# Altium footprint library Module.PcbLib: 42 footprints (part 2 of 3)
Each footprint in its own frame and in the unit in brackets; x right, y up, seen from the top. Pads: shape width x height; smd on the part's side, far side on the other; paste and mask are expansions set on the pad; w line width, h text height; cw(c..) or ccw(c..) is an arc to the next point about the centre after c.
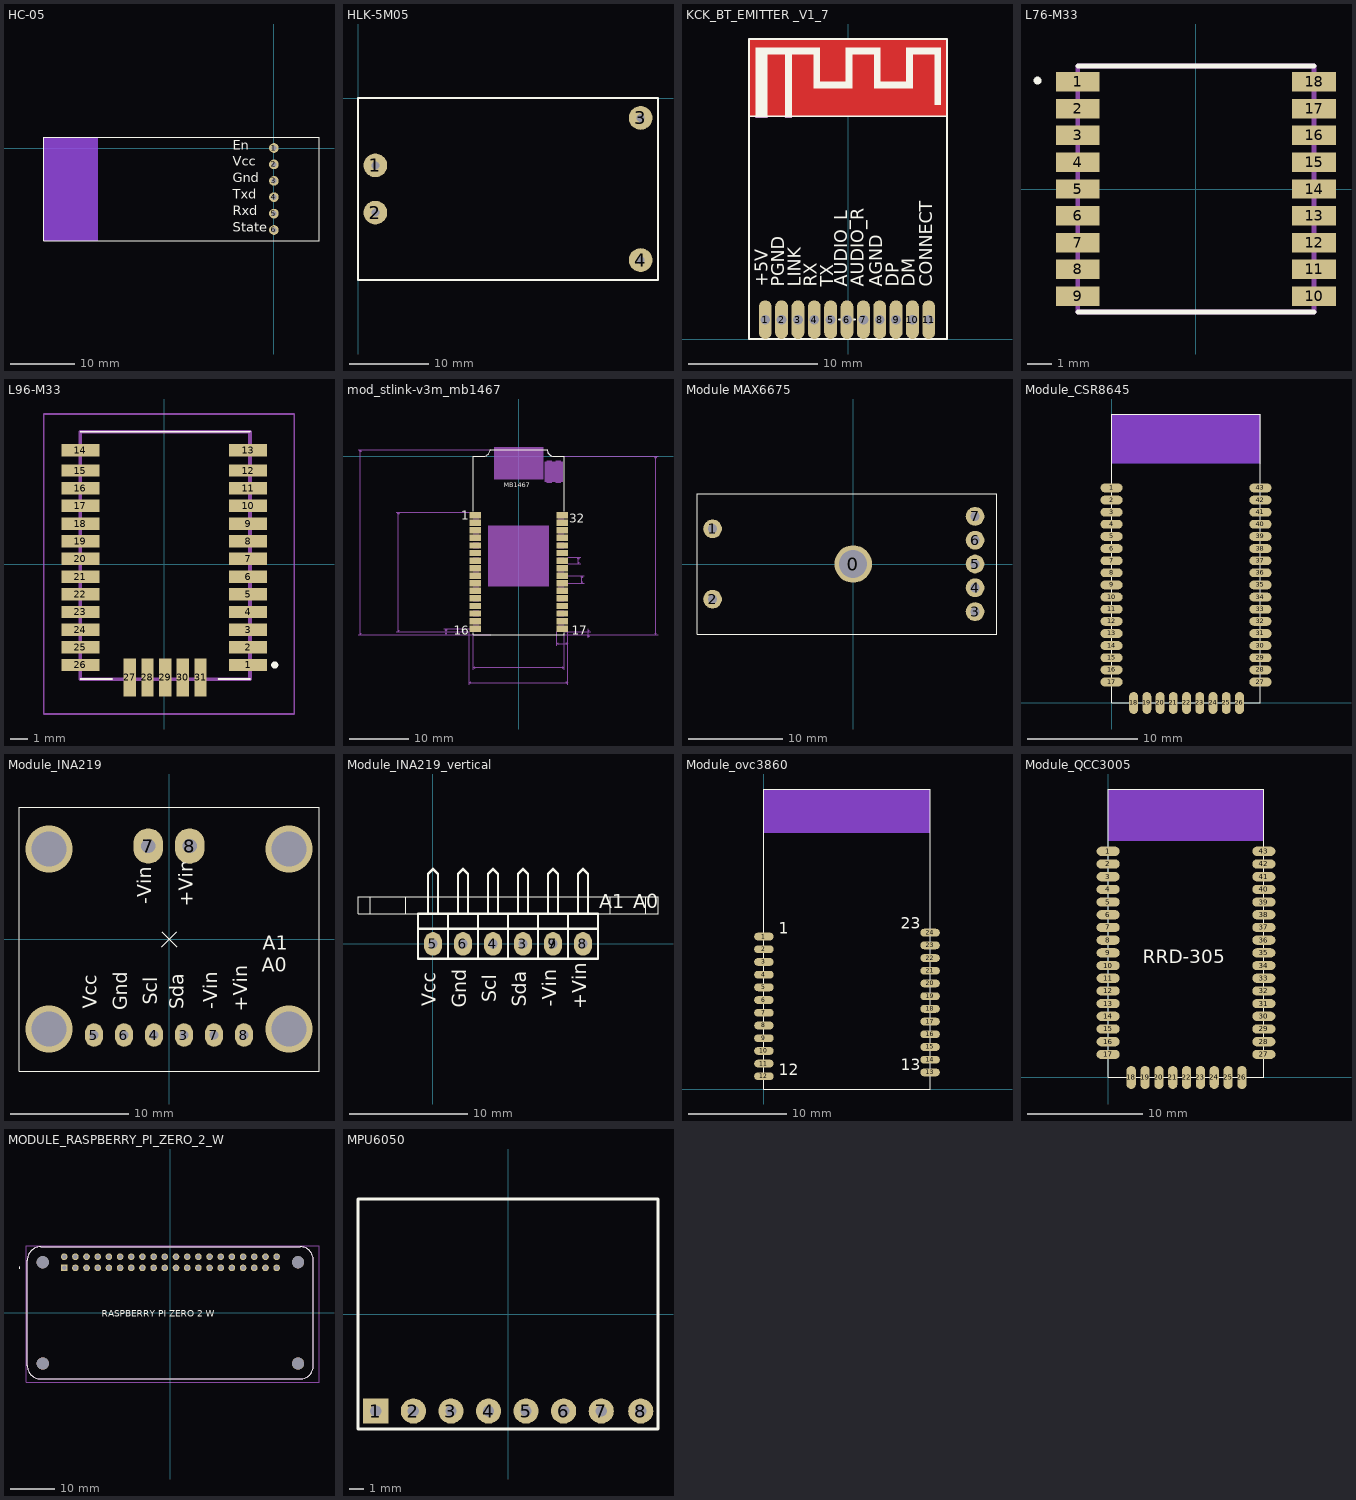
[diagram p1: the footprints below, top view; thin cyan lines are the x and y axes]

## HC-05 [mm]
pads (6):
  round 1.5 hole 0.8: 1(0,0) 2(0,-2.54) 3(0,-5.08) 4(0,-7.62) 5(0,-10.16) 6(0,-12.7)
Top Layer keep-out:
  region: -27.25,-14.4 -27.25,1.7 -35.615,1.7 -35.615,-14.4
Bottom Layer keep-out:
  region: -27.25,-14.4 -27.25,1.7 -35.615,1.7 -35.615,-14.4
Top Overlay:
  lines w0.1: -35.615,-14.4 -35.615,1.7 6.985,1.7 6.985,-14.4 -35.615,-14.4
  text "En" at -6.35,-0.801 h2.5
  text "Vcc" at -6.348,-3.328 h2.5
  text "Gnd" at -6.35,-5.881 h2.5
  text "Txd" at -6.35,-8.408 h2.5
  text "Rxd" at -6.35,-10.948 h2.5
  text "State" at -6.35,-13.501 h2.5
3D body "User Library-hc05.step": height 5.9, standoff 0, extent -35.615,-14.4 6.985,1.7

## HC-SR04 [mm] "HC-SR04"
3D body "User Library-HC-SR04.STEP": height 12, standoff -6.07, extent 0,-4.68 45,20.5

## HLK-5M05 [mm] "5W ultra-compact AC/DC power module HLK-5M05"
height 18
pads (4):
  round 3 hole 1: 1(2.2,-8.5) 2(2.2,-14.5) 3(35.8,-2.5) 4(35.8,-20.5)
Top Overlay:
  lines w0.254: 0,-23 0,0 38,0 38,-23 0,-23
3D body: height 18, standoff 0.25, extent 0,-23 38,0
3D body: height 0.25, standoff 0, extent 0,0 0,0
3D body: height 0.25, standoff 0, extent 5.1,-18.8 5.1,-18.8

## KCK_BT_EMITTER _V1_7 [mm]
pads (11):
  oval 1x3 hole 0.762: 1(-6.43,1.5) 2(-5.16,1.5) 3(-3.89,1.5) 4(-2.62,1.5) 5(-1.35,1.5) 6(-0.08,1.5) 7(1.19,1.5) 8(2.46,1.5) 9(3.73,1.5) 10(5,1.5) 11(6.27,1.5)
Top Layer:
  pour cut-out: -7.7,17.3 -7.7,23.3 7.7,23.3 7.7,17.3
Bottom Layer:
  pour cut-out: -7.7,17.3 -7.7,23.3 7.7,23.3 7.7,17.3
Top Overlay:
  region: 7.22,18.18 7.22,22.62 4.52,22.62 4.52,19.98 2.52,19.98 2.52,22.62 -0.18,22.62 -0.18,19.98 -2.18,19.98 -2.18,22.62 -7.18,22.62 -7.18,17.22 -6.28,17.22 -6.28,22.12 -4.88,22.12 -4.88,17.22 -4.38,17.22 -4.38,22.12 -2.68,22.12 -2.68,19.48 0.32,19.48 0.32,22.12 2.02,22.12 2.02,19.48 5.02,19.48 5.02,22.12 6.72,22.12 6.72,18.18
  lines w0.15: -7.7,17.3 7.7,17.3 ; -0.715,1.5 0.555,1.5 ; -0.08,1.5 -0.08,0 0,0 ; -7.7,0 7.7,0 7.7,23.3 -7.7,23.3 -7.7,0
  text "PGND" at -4.959,4.064 h1
  text "AGND" at 2.661,4.064 h1
  text "DM" at 5.201,4.064 h1
  text "DP" at 3.931,4.064 h1
  text "AUDIO_R" at 1.224,4.064 h1
  text "AUDIO_L" at -0.046,4.064 h1
  text "TX" at -1.149,4.064 h1
  text "RX" at -2.419,4.064 h1
  text "LINK" at -3.689,4.064 h1
  text "+5V" at -6.229,4.064 h1
  text "CONNECT" at 6.536,4.064 h1
Top Solder:
  rectangle: -7.68,17.72 7.52,22.92
  lines w0.01: -7.18,17.72 -7.68,17.72 ; -7.68,17.72 -7.68,22.92 7.52,22.92 7.52,17.72 -7.68,17.72
Bottom Solder:
  rectangle: -7.68,17.72 7.52,22.92
Mechanical 15:
  lines w0.01: -2.68,19.98 -2.68,19.48 ; -2.68,21.62 -2.68,22.12 ; 2.02,19.98 2.02,19.48 ; 2.02,21.62 2.02,22.12 ; -7.18,17.22 -6.28,17.22 ; -7.18,17.22 -7.18,17.72 -6.28,17.22 ; -7.18,17.22 -7.18,22.12 ; -7.18,22.12 -2.18,22.12 ; -7.18,22.12 -6.28,22.12 ; -7.18,22.12 -6.68,22.12 -7.18,22.12 ; -7.18,22.12 -7.18,22.62 -2.18,22.62 -2.18,22.12 ; -6.28,17.22 -6.28,22.12 ; -6.28,22.12 -4.88,22.12 ; -4.88,22.12 -4.38,22.12 -4.38,17.22 -4.88,17.22 -4.88,22.12 ; -2.68,19.48 -2.18,19.48 ; -2.68,19.48 -2.68,22.12 ; -2.68,22.12 -2.18,22.12 ; -2.68,22.12 -2.18,22.12 ; -2.68,22.12 -2.18,22.12 ; -2.68,22.12 -2.18,22.12 ; -2.18,19.48 -0.18,19.48 ; -2.18,19.48 -2.18,19.98 -0.18,19.98 -0.18,19.48 ; -2.18,19.48 -2.18,22.12 ; -0.18,19.48 0.32,19.48 0.32,22.12 ; -0.18,19.48 -0.18,22.12 ; -0.18,22.12 2.52,22.12 ; -0.18,22.12 0.32,22.12 ; -0.18,22.12 0.32,22.12 ; -0.18,22.12 -0.18,22.62 2.52,22.62 2.52,22.12 ; 2.02,19.48 2.52,19.48 ; 2.02,19.48 2.02,22.12 ; 2.02,22.12 2.52,22.12 ; 2.02,22.12 2.52,22.12 ; 2.52,19.48 4.52,19.48 ; 2.52,19.48 2.52,19.98 4.52,19.98 4.52,19.48 ; 2.52,19.48 2.52,22.12 ; 4.52,19.48 5.02,19.48 5.02,22.12 4.52,22.12 ; 4.52,19.48 4.52,22.12 ; 4.52,22.12 7.22,22.12 ; 4.52,22.12 4.52,22.62 7.22,22.62 7.22,22.12 ; 7.22,22.12 7.22,18.18 6.72,18.18 6.72,22.12 7.22,22.12
3D body: height 2, standoff -0.41, extent -7.7,0 7.7,23.3

## L76-M33 [mm]
pads (18):
  rect 1.8x0.8 smd: 1(-4.85,4.4) 2(-4.85,3.3) 3(-4.85,2.2) 4(-4.85,1.1) 5(-4.85,0) 6(-4.85,-1.1) 7(-4.85,-2.2) 8(-4.85,-3.3) 9(-4.85,-4.4) 10(4.85,-4.4) 11(4.85,-3.3) 12(4.85,-2.2) 13(4.85,-1.1) 14(4.85,0) 15(4.85,1.1) 16(4.85,2.2) 17(4.85,3.3) 18(4.85,4.4)
Top Overlay:
  circle w0.2: c-6.502,4.45 r0.062
  lines w0.2: -4.85,-5.05 4.85,-5.05 ; -4.85,5.05 4.85,5.05
Mechanical 13:
  lines w0.2: -4.85,-5.05 4.85,-5.05 4.85,5.05 -4.85,5.05 -4.85,-5.05
3D body: height 2.5, standoff 0, extent -4.826,-5.08 4.826,5.08

## L96-M33 [mm]
pads (31):
  rect 2.15x0.7 smd: 1(4.746,-5.714) 2(4.746,-4.714) 3(4.746,-3.713) 4(4.746,-2.713) 5(4.746,-1.713) 6(4.746,-0.713) 7(4.746,0.287) 8(4.746,1.287) 9(4.746,2.287) 10(4.746,3.287) 11(4.746,4.287) 12(4.746,5.287) 13(4.746,6.438) 14(-4.744,6.438) 15(-4.744,5.287) 16(-4.744,4.287) 17(-4.744,3.287) 18(-4.744,2.287) 19(-4.744,1.287) 20(-4.744,0.287) 21(-4.744,-0.713) 22(-4.744,-1.713) 23(-4.744,-2.713) 24(-4.744,-3.713) 25(-4.744,-4.714) 26(-4.744,-5.714)
  rect 0.7x2.15 smd: 27(-1.954,-6.412) 28(-0.954,-6.412) 29(0.046,-6.412) 30(1.046,-6.412) 31(2.046,-6.412)
Top Overlay:
  lines w0.1: -4.754,-6.513 -2.954,-6.513 ; -4.754,7.487 4.846,7.487 ; 3.046,-6.513 4.846,-6.513
  lines w0.2: 6.246,-5.814 ccw(c6.246,-5.714) 6.246,-5.614 ccw(c6.246,-5.714) 6.246,-5.814
Mechanical 13:
  lines w0.2: -4.754,-6.513 4.846,-6.513 4.846,7.487 -4.754,7.487 -4.754,-6.513
Mechanical 15:
  lines w0.1: -6.819,-8.487 7.346,-8.487 7.346,8.487 -6.819,8.487 -6.819,-8.487
3D body "User Library-Quectel L96.step": height 2, standoff -0.05, extent -4.81,-6.415 4.81,7.635

## Logic Level Converter - BSS138 [mm]

## mod_stlink-v3m_mb1467 [mil]
pads (32):
  rect 74.8x42.13 smd paste+0 mask+1: 1(-288.19,-390) 2(-288.19,-440) 3(-288.19,-490) 4(-288.19,-540) 5(-288.19,-590) 6(-288.19,-640) 7(-288.19,-690) 8(-288.19,-740) 9(-288.19,-790) 10(-288.19,-840) 11(-288.19,-890) 12(-288.19,-940) 13(-288.19,-990) 14(-288.19,-1040) 15(-288.19,-1090) 16(-288.19,-1140) 17(288.19,-1140) 18(288.19,-1090) 19(288.19,-1040) 20(288.19,-990) 21(288.19,-940) 22(288.19,-890) 23(288.19,-840) 24(288.19,-790) 25(288.19,-740) 26(288.19,-690) 27(288.19,-640) 28(288.19,-590) 29(288.19,-540) 30(288.19,-490) 31(288.19,-440) 32(288.19,-390)
Top Overlay:
  lines w6: -300,-1167.5 -300,-1180 300,-1180 300,-1167.5 ; -300,-362.5 -300,0 -232.28,0 ccw(c-232.28,43.31) -188.97,43.31 ; -188.98,43.31 188.98,43.31 ; 188.97,43.31 ccw(c232.28,43.31) 232.28,0 300,0 300,-362.5
  text "MB1467" at -100,-205.5 h31
  text "32" at 335,-438.5 h59
  text "17" at 350,-1179.5 h59
  text "16" at -430,-1179.5 h59
  text "1" at -380,-419.5 h59
Mechanical 7:
  lines w1: -1062.62,-1180 -188.98,-1180 ; -1062.62,43.31 -188.98,43.31 ; -811.25,-1161.07 -325.59,-1161.07 -325.59,-1511.66 ; -811.25,-368.94 -325.59,-368.94 ; -494.76,-1180 -320,-1180 ; -494.76,-1140 -320,-1140 ; -300,-1411.59 -300,-1180 ; 250.79,-1254.71 250.79,-1161.07 ; 300,-1411.59 300,-1180 ; 300,-1161.07 476.27,-1161.07 ; 300,0 921.1,0 ; 325.59,-1511.66 325.59,-1161.07 325.59,-1254.71 ; 325.59,-711.07 410.28,-711.07 ; 325.59,-668.93 410.28,-668.93 ; 328,-839 433.05,-839 ; 328,-789 433.05,-789 ; 461.27,-1201.07 461.27,-1161.07 ; 461.27,-1140 461.27,-1180 ; 476.27,-1180 300,-1180 ; 921.1,-1180 300,-1180 ; -1047.62,-1180 -1042.62,-1170 -1052.62,-1170 -1047.62,-1180 ; -1047.62,-1180 -1047.62,43.31 ; -1047.62,43.31 -1052.62,33.31 -1042.62,33.31 -1047.62,43.31 ; -796.25,-1161.07 -791.25,-1151.07 -801.25,-1151.07 -796.25,-1161.07 ; -796.25,-1161.07 -796.25,-368.94 ; -796.25,-368.94 -801.25,-378.93 -791.25,-378.93 -796.25,-368.94 ; -479.76,-1180 -474.76,-1170 -484.75,-1170 -479.76,-1180 ; -479.76,-1180 -479.76,-1140 ; -479.76,-1140 -484.75,-1150 -474.76,-1150 -479.76,-1140 ; -325.59,-1496.66 -315.59,-1501.66 -315.59,-1491.66 -325.59,-1496.66 ; -325.59,-1496.66 325.59,-1496.66 ; -300,-1396.59 -290,-1401.59 -290,-1391.59 -300,-1396.59 ; -300,-1396.59 300,-1396.59 ; 250.79,-1239.71 260.79,-1244.71 260.79,-1234.71 250.79,-1239.71 ; 250.79,-1239.71 325.59,-1239.71 ; 300,-1396.59 290,-1391.59 290,-1401.59 300,-1396.59 ; 325.59,-1496.66 315.59,-1491.66 315.59,-1501.66 325.59,-1496.66 ; 325.59,-1239.71 315.59,-1234.71 315.59,-1244.71 325.59,-1239.71 ; 395.28,-711.07 400.28,-701.07 390.28,-701.07 395.28,-711.07 ; 395.28,-711.07 395.28,-668.93 ; 395.28,-668.93 390.28,-678.93 400.28,-678.93 395.28,-668.93 ; 418.05,-839 423.05,-829 413.05,-829 418.05,-839 ; 418.05,-839 418.05,-789 ; 418.05,-789 413.05,-799 423.05,-799 418.05,-789 ; 461.27,-1180 456.27,-1190 466.27,-1190 461.27,-1180 ; 461.27,-1161.07 466.27,-1151.07 456.27,-1151.07 461.27,-1161.07 ; 906.1,-1180 911.1,-1170 901.1,-1170 906.1,-1180 ; 906.1,-1180 906.1,0 ; 906.1,0 901.1,-10 911.1,-10 906.1,0
  text "0.019in/0.481mm" at 481.27,-1183.03 h25
  text "1.223in/31.072mm" at -1267.62,-580.85 h25
  text "0.6in/15.24mm" at -81.25,-1441.59 h25
  text "1.18in/29.972mm" at 926.1,-602.5 h25
  text "0.792in/20.12mm" at -1003.75,-777.5 h25
  text "0.651in/16.54mm" at -93.75,-1541.66 h25
  text "0.075in/1.9mm" at 206.94,-1284.71 h25
  text "0.05in/1.27mm" at 438.05,-826.5 h25
  text "0.042in/1.07mm" at 415.28,-702.5 h25
  text "0.04in/1.016mm" at -674.76,-1172.5 h25
Mechanical 15:
  drawing of 292 lines, arcs and shapes, not listed
3D body "STLINK-V3MODS.step": height 177.17, standoff 1.1, extent -300,-1180 300,66.92
3D body: height 10, standoff 0, extent 0,0 10,10

## Module MAX6675 [mm]
pads (8):
  round 4 hole 3: 0(0,0)
  round 2 hole 1: 1(-15,3.75) 2(-15,-3.75) 3(13,-5.08) 4(13,-2.54) 5(13,0) 6(13,2.54) 7(13,5.08)
Top Overlay:
  lines w0.1: -16.66,-7.5 -16.66,7.5 15.34,7.5 15.34,-7.5 -16.66,-7.5

## Module_CSR8645 [mm]
pads (43):
  oval 2x0.8 smd: 1(0,19.5) 2(0,18.4) 3(0,17.3) 4(0,16.2) 5(0,15.1) 6(0,14) 7(0,12.9) 8(0,11.8) 9(0,10.7) 10(0,9.6) 11(0,8.5) 12(0,7.4) 13(0,6.3) 14(0,5.2) 15(0,4.1) 16(0,3) 17(0,1.9) 27(13.5,1.9) 28(13.5,3) 29(13.5,4.1) 30(13.5,5.2) 31(13.5,6.3) 32(13.5,7.4) 33(13.5,8.5) 34(13.5,9.6) 35(13.5,10.7) 36(13.5,11.8) 37(13.5,12.9) 38(13.5,14) 39(13.5,15.1) 40(13.5,16.2) 41(13.5,17.3) 42(13.5,18.4) 43(13.5,19.5)
  oval 0.8x2 smd: 18(2,0) 19(3.2,0) 20(4.4,0) 21(5.6,0) 22(6.8,0) 23(8,0) 24(9.2,0) 25(10.4,0) 26(11.6,0)
Bottom Layer keep-out:
  rectangle: 0,21.7 13.5,26.2
Top Overlay:
  lines w0.1: 0,0 0,26.2 13.5,26.2 13.5,0 0,0

## Module_INA219 [mm]
pads (8):
  oval 1.5x2 hole 0.8: 3(1.27,-8.128) 4(-1.27,-8.128) 5(-6.35,-8.128) 6(-3.81,-8.128) 7(3.81,-8.128) 8(6.35,-8.128)
  oval 2.5x3 hole 1.2: 7(-1.75,7.874) 8(1.75,7.874)
via 10.16,-7.62 diameter 4 hole 3
via -10.16,-7.62 diameter 4 hole 3
via -10.16,7.62 diameter 4 hole 3
via 10.16,7.62 diameter 4 hole 3
Top Overlay:
  lines w0.1: -0.635,-0.635 0.635,0.635 ; -0.635,0.635 0.635,-0.635 ; 12.7,7.874 12.7,-11.176 ; 12.7,-11.176 12.7,11.176 -12.7,11.176 -12.7,-11.176 12.7,-11.176
  text "A1" at 7.959,-1.278 h2
  text "A0" at 7.836,-3.172 h2
  text "Vcc" at -5.719,-5.925 h2
  text "Gnd" at -3.169,-6.024 h2
  text "Scl" at -0.629,-5.586 h2
  text "Sda" at 1.641,-5.96 h2
  text "-Vin" at 4.451,-5.948 h2
  text "+Vin" at 6.991,-6.151 h2
  text "-Vin" at -1.109,2.942 h2
  text "+Vin" at 2.391,2.739 h2

## Module_INA219_vertical [mm]
pads (7):
  oval 1.5x2 hole 0.8: 3(7.62,0) 4(5.08,0) 5(0,0) 6(2.54,0) 7(10.16,0) 8(12.7,0) 9(10.16,0)
Top Overlay:
  lines w0.1: -6.35,2.54 -6.35,3.99 19.05,3.99 19.05,2.54 -6.35,2.54 ; -5.31,2.54 -5.31,3.99 -2.31,3.99 -2.31,2.54 -5.31,2.54 ; 15.01,2.54 15.01,3.99 18.01,3.99 18.01,2.54 15.01,2.54
  lines w0.2: -0.423,2.54 -0.423,5.927 0,6.35 0.423,5.927 0.423,2.54 ; 2.117,2.54 2.117,5.927 2.54,6.35 2.963,5.927 2.963,2.54 ; 4.657,2.54 4.657,5.927 5.08,6.35 5.503,5.927 5.503,2.54 ; 7.197,2.54 7.197,5.927 7.62,6.35 8.043,5.927 8.043,2.54 ; 9.737,2.54 9.737,5.927 10.16,6.35 10.583,5.927 10.583,2.54 ; 12.277,2.54 12.277,5.927 12.7,6.35 13.123,5.927 13.123,2.54 ; -1.27,1.27 -1.27,-1.27 1.27,-1.27 ; -1.27,1.27 -1.27,2.54 1.27,2.54 ; -1.27,1.27 1.27,1.27 ; 1.27,-1.27 1.27,1.27 ; 1.27,-1.27 1.27,1.27 ; 1.27,-1.27 3.81,-1.27 ; 1.27,1.27 1.27,2.54 ; 1.27,1.27 1.27,2.54 ; 1.27,1.27 3.81,1.27 ; 1.27,2.54 3.81,2.54 ; 3.81,-1.27 3.81,1.27 ; 3.81,-1.27 3.81,1.27 ; 3.81,-1.27 6.35,-1.27 ; 3.81,1.27 3.81,2.54 ; 3.81,1.27 3.81,2.54 ; 3.81,1.27 6.35,1.27 ; 3.81,2.54 6.35,2.54 ; 6.35,-1.27 6.35,1.27 ; 6.35,-1.27 8.89,-1.27 ; 6.35,-1.27 6.35,1.27 ; 6.35,1.27 6.35,2.54 ; 6.35,1.27 8.89,1.27 ; 6.35,1.27 6.35,2.54 ; 6.35,2.54 8.89,2.54 ; 8.89,-1.27 8.89,1.27 ; 8.89,-1.27 11.43,-1.27 ; 8.89,-1.27 8.89,1.27 ; 8.89,1.27 8.89,2.54 ; 8.89,1.27 11.43,1.27 ; 8.89,1.27 8.89,2.54 ; 8.89,2.54 11.43,2.54 ; 11.43,-1.27 11.43,1.27 ; 11.43,-1.27 13.97,-1.27 13.97,1.27 ; 11.43,-1.27 11.43,1.27 ; 11.43,1.27 11.43,2.54 ; 11.43,1.27 13.97,1.27 ; 11.43,1.27 11.43,2.54 ; 11.43,2.54 13.97,2.54 13.97,1.27
  text "A1" at 14.079,2.622 h2
  text "A0" at 16.957,2.633 h2
  text "Vcc" at 0.631,-5.29 h2
  text "Gnd" at 3.181,-5.389 h2
  text "Scl" at 5.721,-4.95 h2
  text "Sda" at 8.261,-5.324 h2
  text "-Vin" at 10.801,-5.312 h2
  text "+Vin" at 13.341,-5.516 h2
3D body: height 25.35, standoff 3, extent -6.35,2.54 19.05,3.99
3D body "PLS-1R.step": height 5.45, standoff -3, extent 11.43,-1.27 13.97,7.35
3D body "PLS-1R.step": height 5.45, standoff -3, extent 8.89,-1.27 11.43,7.35
3D body "PLS-1R.step": height 5.45, standoff -3, extent 6.35,-1.27 8.89,7.35
3D body "PLS-1R.step": height 5.45, standoff -3, extent -1.27,-1.27 1.27,7.35
3D body "PLS-1R.step": height 5.45, standoff -3, extent 1.27,-1.27 3.81,7.35
3D body "PLS-1R.step": height 5.45, standoff -3, extent 3.81,-1.27 6.35,7.35

## Module_ovc3860 [mm]
pads (24):
  oval 2x0.8 smd: 1(0,15.6) 2(0,14.3) 3(0,13) 4(0,11.7) 5(0,10.4) 6(0,9.1) 7(0,7.8) 8(0,6.5) 9(0,5.2) 10(0,3.9) 11(0,2.6) 12(0,1.3) 13(17,1.7) 14(17,3) 15(17,4.3) 16(17,5.6) 17(17,6.9) 18(17,8.2) 19(17,9.5) 20(17,10.8) 21(17,12.1) 22(17,13.4) 23(17,14.7) 24(17,16)
Bottom Layer keep-out:
  rectangle: 0,26.2 17,30.7
Top Overlay:
  lines w0.1: 0,0 0,30.7 17,30.7 17,0 0,0
  text "23" at 14,16 h2
  text "13" at 14,1.5 h2
  text "12" at 1.5,1 h2
  text "1" at 1.5,15.5 h2

## Module_QCC3005 [mm]
pads (43):
  oval 2x0.8 smd: 1(0,19.6) 2(0,18.5) 3(0,17.4) 4(0,16.3) 5(0,15.2) 6(0,14.1) 7(0,13) 8(0,11.9) 9(0,10.8) 10(0,9.7) 11(0,8.6) 12(0,7.5) 13(0,6.4) 14(0,5.3) 15(0,4.2) 16(0,3.1) 17(0,2) 27(13.5,2) 28(13.5,3.1) 29(13.5,4.2) 30(13.5,5.3) 31(13.5,6.4) 32(13.5,7.5) 33(13.5,8.6) 34(13.5,9.7) 35(13.5,10.8) 36(13.5,11.9) 37(13.5,13) 38(13.5,14.1) 39(13.5,15.2) 40(13.5,16.3) 41(13.5,17.4) 42(13.5,18.5) 43(13.5,19.6)
  oval 0.8x2 smd: 18(2,0) 19(3.2,0) 20(4.4,0) 21(5.6,0) 22(6.8,0) 23(8,0) 24(9.2,0) 25(10.4,0) 26(11.6,0)
Top Layer keep-out:
  rectangle: 0,20.5 13.5,25
Bottom Layer keep-out:
  rectangle: 0,20.5 13.5,25
Top Overlay:
  lines w0.1: 0,0 13.5,0 13.5,25 0,25 0,0
  text "RRD-305" at 3,9.5 h2

## MODULE_RASPBERRY_PI_ZERO_2_W [mm]
pads (44):
  rect 1.508x1.508 / inner round 1.508 / far side rect 1.508x1.508 hole 1: 1(-24.13,10.23)
  round 1.508 hole 1: 2(-24.13,12.77) 3(-21.59,10.23) 4(-21.59,12.77) 5(-19.05,10.23) 6(-19.05,12.77) 7(-16.51,10.23) 8(-16.51,12.77) 9(-13.97,10.23) 10(-13.97,12.77) 11(-11.43,10.23) 12(-11.43,12.77) 13(-8.89,10.23) 14(-8.89,12.77) 15(-6.35,10.23) 16(-6.35,12.77) 17(-3.81,10.23) 18(-3.81,12.77) 19(-1.27,10.23) 20(-1.27,12.77) 21(1.27,10.23) 22(1.27,12.77) 23(3.81,10.23) 24(3.81,12.77) 25(6.35,10.23) 26(6.35,12.77) 27(8.89,10.23) 28(8.89,12.77) 29(11.43,10.23) 30(11.43,12.77) 31(13.97,10.23) 32(13.97,12.77) 33(16.51,10.23) 34(16.51,12.77) 35(19.05,10.23) 36(19.05,12.77) 37(21.59,10.23) 38(21.59,12.77) 39(24.13,10.23) 40(24.13,12.77)
  round 2.75 hole 2.75 unplated: ""(-29,-11.5) ""(-29,11.5) ""(29,-11.5) ""(29,11.5)
Top Overlay:
  circle w0.2: c-34.29,10.23 r0.1
  lines w0.127: 4.4,-15 12.75,-15 ; 17,-15 25.35,-15 ; -32.5,-12 ccw(c-29.5,-12) -29.5,-15 29.5,-15 ccw(c29.5,-12) 32.5,-12 32.5,12 ccw(c29.5,12) 29.5,15 -29.5,15 ccw(c-29.5,12) -32.5,12 -32.5,-12
  text "RASPBERRY PI ZERO 2 W" at -15.621,-0.889 h1.52
Mechanical 13:
  circle w0.2: c-34.29,10.23 r0.1
  lines w0.127: 4.4,-15 12.75,-15 ; 17,-15 25.35,-15 ; -32.5,-12 ccw(c-29.5,-12) -29.5,-15 29.5,-15 ccw(c29.5,-12) 32.5,-12 32.5,12 ccw(c29.5,12) 29.5,15 -29.5,15 ccw(c-29.5,12) -32.5,12 -32.5,-12
Mechanical 15:
  lines w0.05: -32.75,-15.75 33.75,-15.75 33.75,15.25 -32.75,15.25 -32.75,-15.75
3D body "Raspberry Pi Zero 2 W.STEP": height 5.25, standoff 0.2, extent -32.5,-15.576 33.3,15

## MPU6050 [mm]
pads (8):
  rect 1.7x1.7 hole 0.762: 1(-8.938,-6.562)
  round 1.7 hole 0.762: 2(-6.398,-6.562) 3(-3.858,-6.562) 4(-1.318,-6.562) 5(1.222,-6.562) 6(3.762,-6.562) 7(6.302,-6.562) 8(8.97,-6.562)
Top Overlay:
  lines w0.2: -10.138,-7.787 -10.138,7.788 10.138,7.788 10.138,-7.787 -10.138,-7.787
3D body "User Library-GY-521.STEP": height 7.77, standoff -4.05, extent -10.125,-7.8 10.195,7.445